# Altium footprint library ADNB95C.PcbLib: 249 footprints (part 4 of 16)
Each footprint in its own frame and in the unit in brackets; x right, y up, seen from the top. Pads: shape width x height; smd on the part's side, far side on the other; paste and mask are expansions set on the pad; w line width, h text height; cw(c..) or ccw(c..) is an arc to the next point about the centre after c.
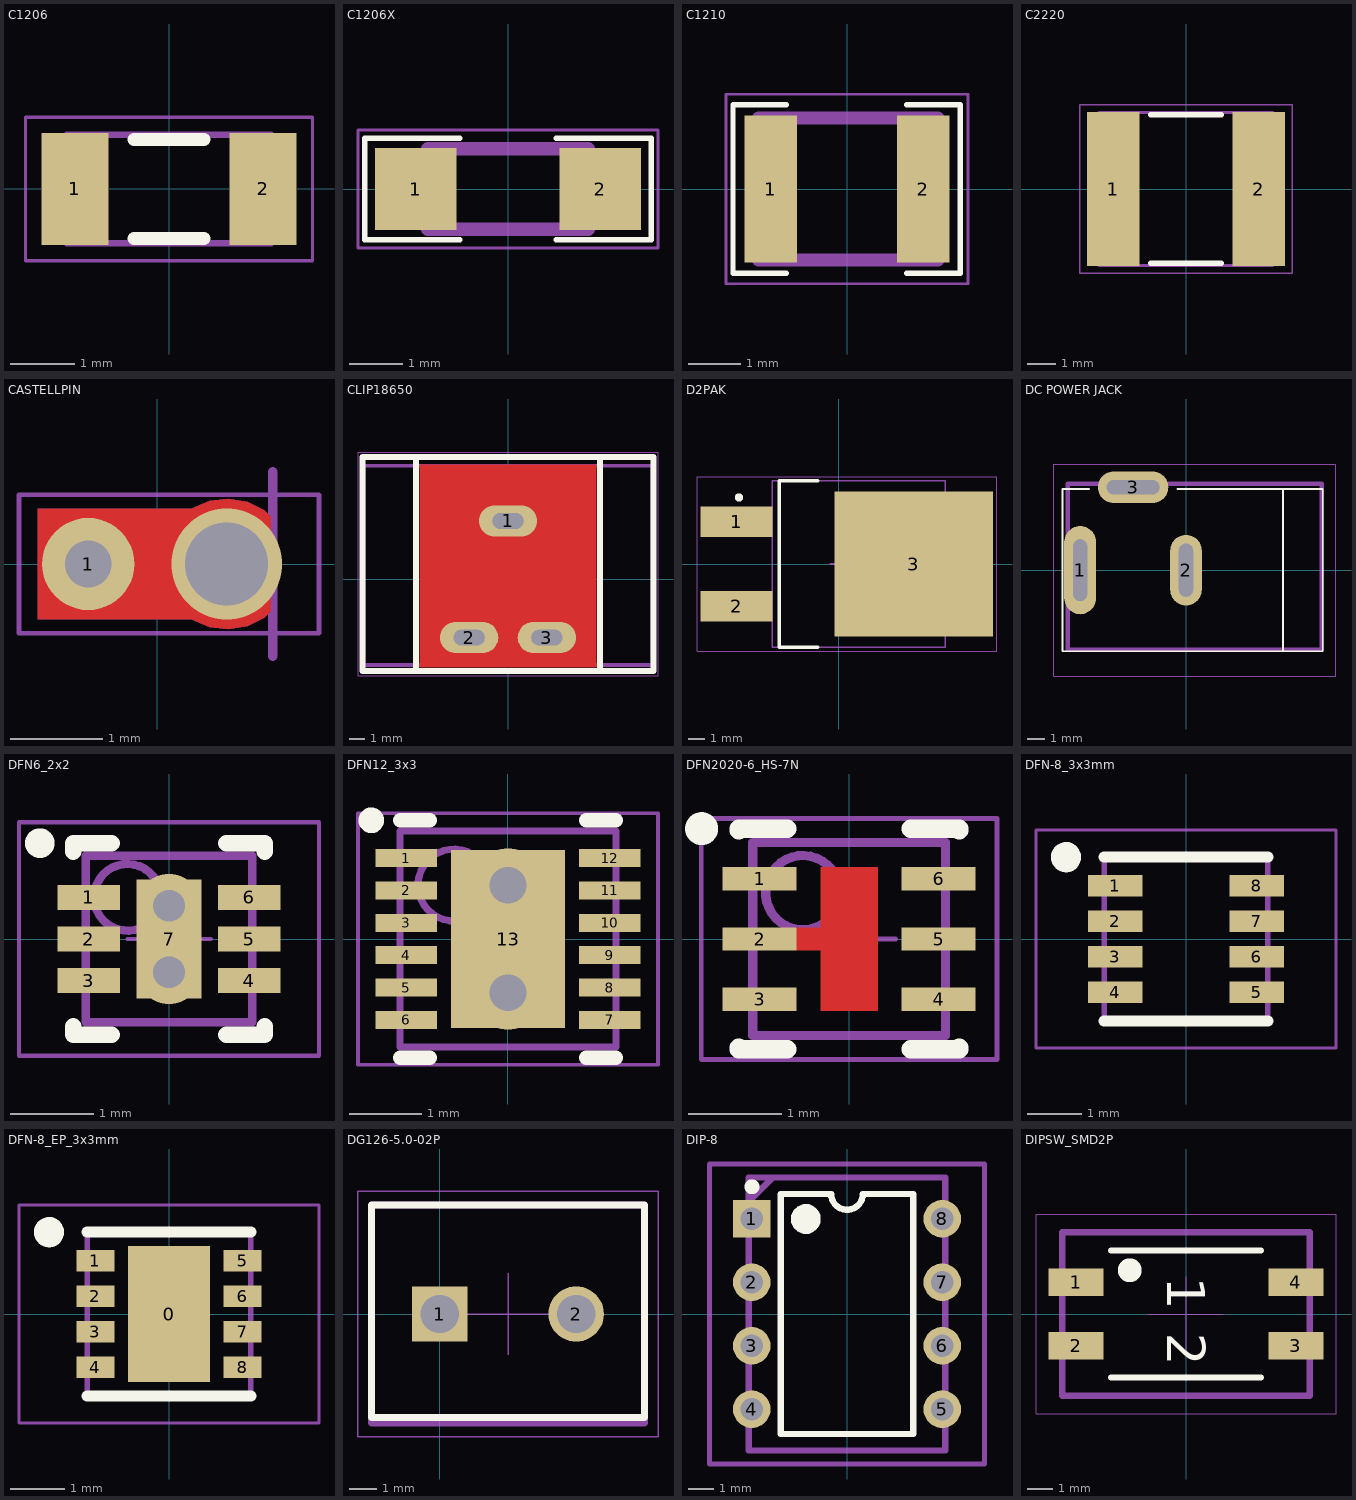
[diagram p3: the footprints below, top view; thin cyan lines are the x and y axes]

## C1206 [mm]
height 0.65
pads (2):
  rect 1.05x1.75 smd: 1(-1.475,0) 2(1.475,0)
Top Overlay:
  lines w0.2: -0.55,-0.775 0.55,-0.775 ; -0.55,0.775 0.55,0.775
Top Designator (Mech7):
  text ".Designator" at -3.809,-0.254 h0.76
Top Assembly:
  lines w0.1: -1.6,-0.85 1.6,-0.85 1.6,0.85 -1.6,0.85 -1.6,-0.85
Top Courtyard:
  lines w0.05: -2.25,-1.125 2.25,-1.125 2.25,1.125 -2.25,1.125 -2.25,-1.125
3D body "70096219.stp": height 1.12, standoff 0.02, extent -1.7,-0.9 1.7,0.9

## C1206X [mil] "Chip Capacitor;"
pads (2):
  rect 60x60 smd: 1(-67.91,0) 2(67.91,0)
Top Overlay:
  lines w3.94: -35.43,-37.4 -105.31,-37.4 -105.31,37.4 -35.43,37.4 ; 35.43,-37.4 105.31,-37.4 105.31,37.4 35.43,37.4
Top Designator (Mech7):
  text ".Designator" at -149.95,-10 h30
Top Assembly:
  lines w10: -59.06,-29.53 -59.06,29.53 59.06,29.53 59.06,-29.53 -59.06,-29.53
Top Courtyard:
  lines w1.97: -110.24,-43.31 110.24,-43.31 110.24,43.31 -110.24,43.31 -110.24,-43.31
3D body "SW3dPS-1206 SMD Capacitor.STEP": height 39.45, standoff 0, extent -62.99,-31.5 63,31.49

## C1210 [mm]
height 3
pads (2):
  rect 1x2.8 smd: 1(-1.45,0) 2(1.45,0)
Top Overlay:
  lines w0.1: -1.15,-1.6 -2.166,-1.6 -2.166,1.6 -1.15,1.6 ; 1.136,-1.6 2.152,-1.6 2.152,1.6 1.136,1.6
Top Designator (Mech7):
  text ".Designator" at -3.809,-0.254 h0.76
Top Assembly:
  lines w0.254: -1.675,-1.35 1.725,-1.35 1.725,1.35 -1.675,1.35 -1.675,-1.35
Top Courtyard:
  lines w0.05: -2.3,-1.8 -2.3,1.8 2.3,1.8 2.3,-1.8 -2.3,-1.8
3D body "c1210c335k5ractu.stp": height 1.92, standoff 0.02, extent -1.675,-1.35 1.725,1.35

## C2220 [mm] "Chip Capacitor, 2-Leads, Body 5.7x5.0mm, IPC Medium Density"
height 2.5
pads (2):
  rect 1.85x5.45 smd: 1(-2.575,0) 2(2.575,0)
Top Overlay:
  lines w0.2: -1.25,-2.625 1.25,-2.625 ; -1.25,2.625 1.25,2.625
Top Designator (Mech7):
  text ".Designator" at -3.809,-0.254 h0.76
Top Assembly:
  lines w0.1: -3.075,-2.7 3.075,-2.7 3.075,2.7 -3.075,2.7 -3.075,-2.7
Top Courtyard:
  lines w0.05: -3.75,-2.975 3.75,-2.975 3.75,2.975 -3.75,2.975 -3.75,-2.975
3D body "User Library-CAPC5750X23.STEP": height 2.3, standoff 0, extent -2.85,-2.5 2.85,2.5

## CASTELLPIN [mm]
height 2.5
pads (1):
  round 1 hole 0.508: 1(-0.75,0)
via 0.75,0 diameter 1.2 hole 0.9
Top Layer:
  rectangle: -1.3,-0.6 0.378,0.6
  region: 1.229,-0.51 1.155,-0.58 0.971,-0.672 0.769,-0.707 0.566,-0.683 0.378,-0.602 0.221,-0.47 0.109,-0.299 0.05,-0.102 0.05,0.102 0.109,0.299 0.221,0.47 0.378,0.602 0.566,0.683 0.769,0.707 0.971,0.672 1.155,0.58 1.229,0.51 1.229,0.27 1.179,0.345 1.044,0.465 0.879,0.535 0.699,0.548 0.525,0.502 0.375,0.403 0.265,0.26 0.207,0.09 0.207,-0.09 0.265,-0.26 0.375,-0.403 0.525,-0.502 0.699,-0.548 0.879,-0.535 1.044,-0.465 1.179,-0.345 1.229,-0.27
Bottom Layer:
  rectangle: -1.3,-0.6 0.378,0.6
  region: 1.229,0.51 1.155,0.58 0.971,0.672 0.769,0.707 0.566,0.683 0.378,0.602 0.221,0.47 0.109,0.299 0.05,0.102 0.05,-0.102 0.109,-0.299 0.221,-0.47 0.378,-0.602 0.566,-0.683 0.769,-0.707 0.971,-0.672 1.155,-0.58 1.229,-0.51 1.229,-0.27 1.179,-0.345 1.044,-0.465 0.879,-0.535 0.699,-0.548 0.525,-0.502 0.375,-0.403 0.265,-0.26 0.207,-0.09 0.207,0.09 0.265,0.26 0.375,0.403 0.525,0.502 0.699,0.548 0.879,0.535 1.044,0.465 1.179,0.345 1.229,0.27
Mechanical 1:
  lines w0.1: 1.25,-1 1.25,1
Top Designator (Mech7):
  text ".Designator" at -3.759,-0.254 h0.76
Top Courtyard:
  lines w0.05: -1.5,-0.75 -1.5,0.75 1.75,0.75 1.75,-0.75 -1.5,-0.75

## CLIP18650 [mil] "battery clip 18650"
pads (3):
  oval 150x80 hole 40 slot 80 at 0 deg: 1(0,150) 2(-100,-150) 3(100,-150)
Top Layer:
  region: -226.38,295.28 226.38,295.28 226.38,-226.38 -226.38,-226.38
Bottom Layer:
  region: -157.48,-216.54 -196.85,-177.17 -196.85,177.17 -157.48,216.54 157.48,216.54 196.85,177.17 196.85,-177.17 157.48,-216.54
Top Overlay:
  lines w15: -236.22,-236.22 -236.22,314.96 ; 236.22,-236.22 236.22,314.96 ; -374.02,-236.22 374.02,-236.22 374.02,314.96 -374.02,314.96 -374.02,-236.22
Top Designator (Mech7):
  text ".Designator" at -299.9,-19.99 h60
Top Assembly:
  lines w10: -371.78,-219.97 371.82,-219.97 371.82,292.12 -371.78,292.12 -371.78,-219.97
Top Courtyard:
  lines w1.97: -59.06,0 59.06,0 ; 0,-59.06 0,59.06 ; -385.83,-248.03 -385.83,326.77 385.83,326.77 385.83,-248.03 -385.83,-248.03
3D body "KEYELCO_54_clip.STEP": height 715.64, standoff -119.49, extent -371.78,-219.97 371.81,292.11

## D2PAK [mm] "D2-PAK, 3-Pads, Body 8.30x8.36mm (max), IPC Medium Density"
height 4.6
pads (3):
  rect 4.35x1.85 smd: 1(-6.15,2.54) 2(-6.15,-2.54)
  rect 9.5x8.7 smd: 3(4.5,0)
Top Overlay:
  circle w0.25: c-6,4 r0.125
  lines w0.2: -1.25,-5 -3.575,-5 -3.575,5 -1.25,5
Top Designator (Mech7):
  text ".Designator" at -6.118,-0.508 h1.52
Top Assembly:
  lines w0.1: -4,-5 -4,5 6.4,5 6.4,-5 -4,-5
Top Courtyard:
  lines w0.05: -8.525,-5.25 -8.525,5.25 9.5,5.25 9.5,-5.25 -8.525,-5.25
  lines w0.1: -0.5,0 0.5,0 ; 0,-0.5 0,0.5
3D body "User Library-DPAK.STEP": height 4.78, standoff -0.24, extent -6.916,-5.08 8.347,5.08

## DC POWER JACK [mm]
height 1.75
pads (3):
  oval 1.8x5 hole 0.8 slot 3.5 at 90 deg mask+0: 1(-6,0)
  oval 1.8x4 hole 0.8 slot 3 at 90 deg mask+0: 2(0,0)
  oval 4x1.8 hole 0.8 slot 3 at 0 deg mask+0: 3(-3,4.7)
Top Overlay:
  lines w0.1: -5.5,4.6 -7,4.6 -7,-4.6 7.75,-4.6 7.75,4.6 -0.5,4.6 ; 5.5,-4.6 5.5,4.6
Top Designator (Mech7):
  text ".Designator" at -7.243,-0.033 h1.52
Top Assembly:
  lines w0.254: -6.7,-4.5 7.7,-4.5 7.7,4.9 -6.7,4.9 -6.7,-4.5
Top Courtyard:
  lines w0.05: -7.5,-6 -7.5,6 8.5,6 8.5,-6 -7.5,-6
3D body "pj-002b.stp": height 11.01, standoff -3.49, extent -6.7,-4.5 7.7,4.9

## DFN6_2x2 [mm] "SON, 6-Leads, Body 2.00x2.00mm, Pitch 0.50mm, Thermal Pad 1.43x0.78mm, IPC Medium Density"
height 0.8
pads (7):
  rect 0.75x0.3 smd mask+0.076: 1(-0.965,0.5) 2(-0.965,0) 3(-0.965,-0.5) 4(0.965,-0.5) 5(0.965,0) 6(0.965,0.5)
  rect 0.78x1.43 smd mask+0.076: 7(0,0)
via 0,-0.4 diameter 0.762 hole 0.381
via 0,0.4 diameter 0.762 hole 0.381
Top Overlay:
  circle w0.254: c-1.55,1.15 r0.05
  lines w0.2: -1.15,-1.05 -1.15,-1.15 -0.69,-1.15 ; -1.15,1.05 -1.15,1.15 -0.69,1.15 ; 0.69,-1.15 1.15,-1.15 1.15,-1.05 ; 0.69,1.15 1.15,1.15 1.15,1.05
Top Designator (Mech7):
  text ".Designator" at -3.809,-0.254 h0.76
Top Assembly:
  circle w0.1: c-0.5,0.5 r0.4
  lines w0.1: -1,-1 1,-1 1,1 -1,1 -1,-1
Top Courtyard:
  lines w0.05: -0.5,0 0.5,0 ; 0,-0.5 0,0.5 ; -1.8,-1.4 1.8,-1.4 1.8,1.4 -1.8,1.4 -1.8,-1.4
3D body "DFN6_2x2.step": height 0.8, standoff 0, extent -1.02,-1 1.02,1

## DFN12_3x3 [mm] "SON, 12-Leads, Body 3.00x3.00mm, Pitch 0.45mm, Thermal Pad 2.48x1.58mm, IPC Medium Density"
height 0.8
pads (13):
  rect 0.85x0.25 smd mask+0.076: 1(-1.415,1.125) 2(-1.415,0.675) 3(-1.415,0.225) 4(-1.415,-0.225) 5(-1.415,-0.675) 6(-1.415,-1.125) 7(1.415,-1.125) 8(1.415,-0.675) 9(1.415,-0.225) 10(1.415,0.225) 11(1.415,0.675) 12(1.415,1.125)
  rect 1.58x2.48 smd mask+0.076: 13(0,0)
via 0,0.75 diameter 1.016 hole 0.508
via 0,-0.75 diameter 1.016 hole 0.508
Top Overlay:
  circle w0.254: c-1.9,1.65 r0.05
  lines w0.2: -1.5,-1.65 -1.09,-1.65 ; -1.5,1.65 -1.09,1.65 ; 1.09,-1.65 1.5,-1.65 ; 1.09,1.65 1.5,1.65
Top Designator (Mech7):
  text ".Designator" at -3.809,-0.254 h0.76
Top Assembly:
  circle w0.1: c-0.75,0.75 r0.5
  lines w0.1: -1.5,-1.5 -1.5,1.5 1.5,1.5 1.5,-1.5 -1.5,-1.5
Top Courtyard:
  lines w0.05: -0.5,0 0.5,0 ; 0,-0.5 0,0.5 ; -2.085,-1.75 -2.085,1.75 2.085,1.75 2.085,-1.75 -2.085,-1.75
3D body "User Library-DFN12(3x3)-1.STEP": height 0.76, standoff 0, extent -1.501,-1.5 1.501,1.5

## DFN2020-6_HS-7N [mm] "SON, 6-Leads, Body 2.01x2.01mm, Pitch 0.65mm, Thermal Pad 1.55x0.73mm, IPC Medium Density"
height 0.63
pads (6):
  rect 0.8x0.25 smd mask+0.076: 1(-0.965,0.65) 2(-0.965,0) 3(-0.965,-0.65) 4(0.965,-0.65) 5(0.965,0) 6(0.965,0.65)
Top Layer:
  rectangle: -0.31,-0.775 0.31,0.775
  rectangle: -0.575,-0.125 -0.305,0.125
Top Overlay:
  circle w0.254: c-1.59,1.19 r0.05
  lines w0.2: -1.19,-1.175 -1.19,-1.19 -0.665,-1.19 ; -1.19,1.175 -1.19,1.19 -0.665,1.19 ; 0.665,-1.19 1.19,-1.19 1.19,-1.175 ; 0.665,1.19 1.19,1.19 1.19,1.175
Top Solder:
  rectangle: -0.33,-0.787 0.33,0.787
  rectangle: -0.483,-0.152 -0.33,0.152
Top Designator (Mech7):
  text ".Designator" at -3.809,-0.254 h0.76
Top Assembly:
  circle w0.1: c-0.5,0.5 r0.4
  lines w0.1: -1.04,-1.04 -1.04,1.04 1.04,1.04 1.04,-1.04 -1.04,-1.04
Top Courtyard:
  lines w0.05: -0.5,0 0.5,0 ; 0,-0.5 0,0.5 ; -1.595,-1.3 -1.595,1.3 1.595,1.3 1.595,-1.3 -1.595,-1.3
3D body "DFN2020-6_HS-7N.step": height 0.63, standoff 0, extent -1.09,-1.04 1.09,1.04

## DFN-8_3x3mm [mm]
pads (8):
  rect 1x0.4 smd mask+0.051: 1(-1.3,0.975) 2(-1.3,0.325) 3(-1.3,-0.325) 4(-1.3,-0.975) 5(1.3,-0.975) 6(1.3,-0.325) 7(1.3,0.325) 8(1.3,0.975)
Top Overlay:
  circle w0.3: c-2.2,1.5 r0.127
  lines w0.203: -1.5,-1.5 1.5,-1.5 ; -1.5,1.5 1.5,1.5
Top Designator (Mech7):
  text ".Designator" at -3.809,-0.082 h0.76
Top Assembly:
  lines w0.1: -1.5,-1.5 -1.5,1.5 1.5,1.5 1.5,-1.5 -1.5,-1.5
Top Courtyard:
  lines w0.05: -2.75,-2 2.75,-2 2.75,2 -2.75,2 -2.75,-2

## DFN-8_EP_3x3mm [mm]
pads (9):
  rect 1.5x2.5 smd mask+0.051: 0(0,0)
  rect 0.7x0.4 smd mask+0.051: 1(-1.35,0.975) 2(-1.35,0.325) 3(-1.35,-0.325) 4(-1.35,-0.975) 5(1.35,0.975) 6(1.35,0.325) 7(1.35,-0.325) 8(1.35,-0.975)
Top Overlay:
  circle w0.3: c-2.2,1.5 r0.127
  lines w0.203: -1.5,-1.5 1.5,-1.5 ; -1.5,1.5 1.5,1.5
Top Designator (Mech7):
  text ".Designator" at -3.809,-0.082 h0.76
Top Assembly:
  lines w0.1: -1.5,-1.5 1.5,-1.5 1.5,1.5 -1.5,1.5 -1.5,-1.5
Top Courtyard:
  lines w0.05: -2.75,-2 2.75,-2 2.75,2 -2.75,2 -2.75,-2

## DG126-5.0-02P [mil] "DG126-5.0-02P-14-00A(H)"
pads (2):
  rect 80x80 hole 55.12: 1(0,0)
  round 80 hole 55.12: 2(196.85,0)
Top Overlay:
  lines w10: -98.43,-149.61 -98.43,157.48 295.28,157.48 295.28,-149.61 -98.43,-149.61
Top Designator (Mech7):
  text ".Designator" at -201.48,-19.99 h60
Top Assembly:
  lines w10: -98.43,-157.48 -98.43,157.48 295.28,157.48 295.28,-157.48 295.27,-157.48 -98.43,-157.48
Top Courtyard:
  lines w1.97: 39.37,0 157.48,0 ; 98.42,-59.05 98.42,59.06 ; -118.11,-177.16 -118.11,177.17 314.96,177.17 314.96,-177.16 -118.11,-177.16
3D body "17551.stp": height 449.32, standoff -137.3, extent -120.87,-157.48 295.27,196.85

## DIP-8 [mm]
pads (8):
  rect 1.5x1.5 hole 0.9: 1(-3.81,3.81)
  round 1.5 hole 0.9: 2(-3.81,1.27) 3(-3.81,-1.27) 4(-3.81,-3.81) 5(3.81,-3.81) 6(3.81,-1.27) 7(3.81,1.27) 8(3.81,3.81)
Top Overlay:
  circle w0.6: c-1.65,3.8 r0.3
  circle w0.3: c-3.8,5.09 r0.15
  lines w0.254: -2.65,-4.8 2.65,-4.8 2.65,4.8 0.635,4.8 cw(c0,4.8) -0.635,4.8 -2.65,4.8 -2.65,-4.8
Top Designator (Mech7):
  text ".Designator" at -7.618,-0.508 h1.52
Top Assembly:
  lines w0.254: -3.935,4.5 -3,5.435 -3,5.46 ; -3.935,-5.46 3.935,-5.46 3.935,5.46 -3.935,5.46 -3.935,-5.46
Top Courtyard:
  lines w0.2: -5.5,-6 -5.5,6 5.5,6 5.5,-6 -5.5,-6
3D body "SW3dPS-DIP08-300.STEP": height 5.08, standoff -2.49, extent -3.935,-5.46 3.935,5.46

## DIPSW_SMD2P [mm]
pads (4):
  rect 2.2x1.1 smd: 1(-4.4,1.27) 2(-4.4,-1.27) 3(4.4,-1.27) 4(4.4,1.27)
Top Overlay:
  circle w0.75: c-2.25,1.75 r0.1
  lines w0.254: -3,-2.54 3,-2.54 ; -3,2.54 3,2.54
  text "2" at -0.746,-0.754 h1.52
  text "1" at -0.746,1.496 h1.52
Top Designator (Mech7):
  text ".Designator" at -7.618,-0.508 h1.52
Top Assembly:
  lines w0.254: -4.95,-3.275 4.95,-3.275 4.95,3.275 -4.95,3.275 -4.95,-3.275
Top Courtyard:
  lines w0.05: -1.5,0 1.5,0 ; 0,-1.5 0,1.5 ; -6,-4 -6,4 6,4 6,-4 -6,-4
3D body "User Library-DIP SW 2P.STEP": height 4.16, standoff 0.01, extent -4.95,-3.275 4.95,3.275